# Altium footprint library Kon_Tipk.PCBLIB: 113 footprints (part 7 of 8)
Each footprint in its own frame and in the unit in brackets; x right, y up, seen from the top. Pads: shape width x height; smd on the part's side, far side on the other; paste and mask are expansions set on the pad; w line width, h text height; cw(c..) or ccw(c..) is an arc to the next point about the centre after c.
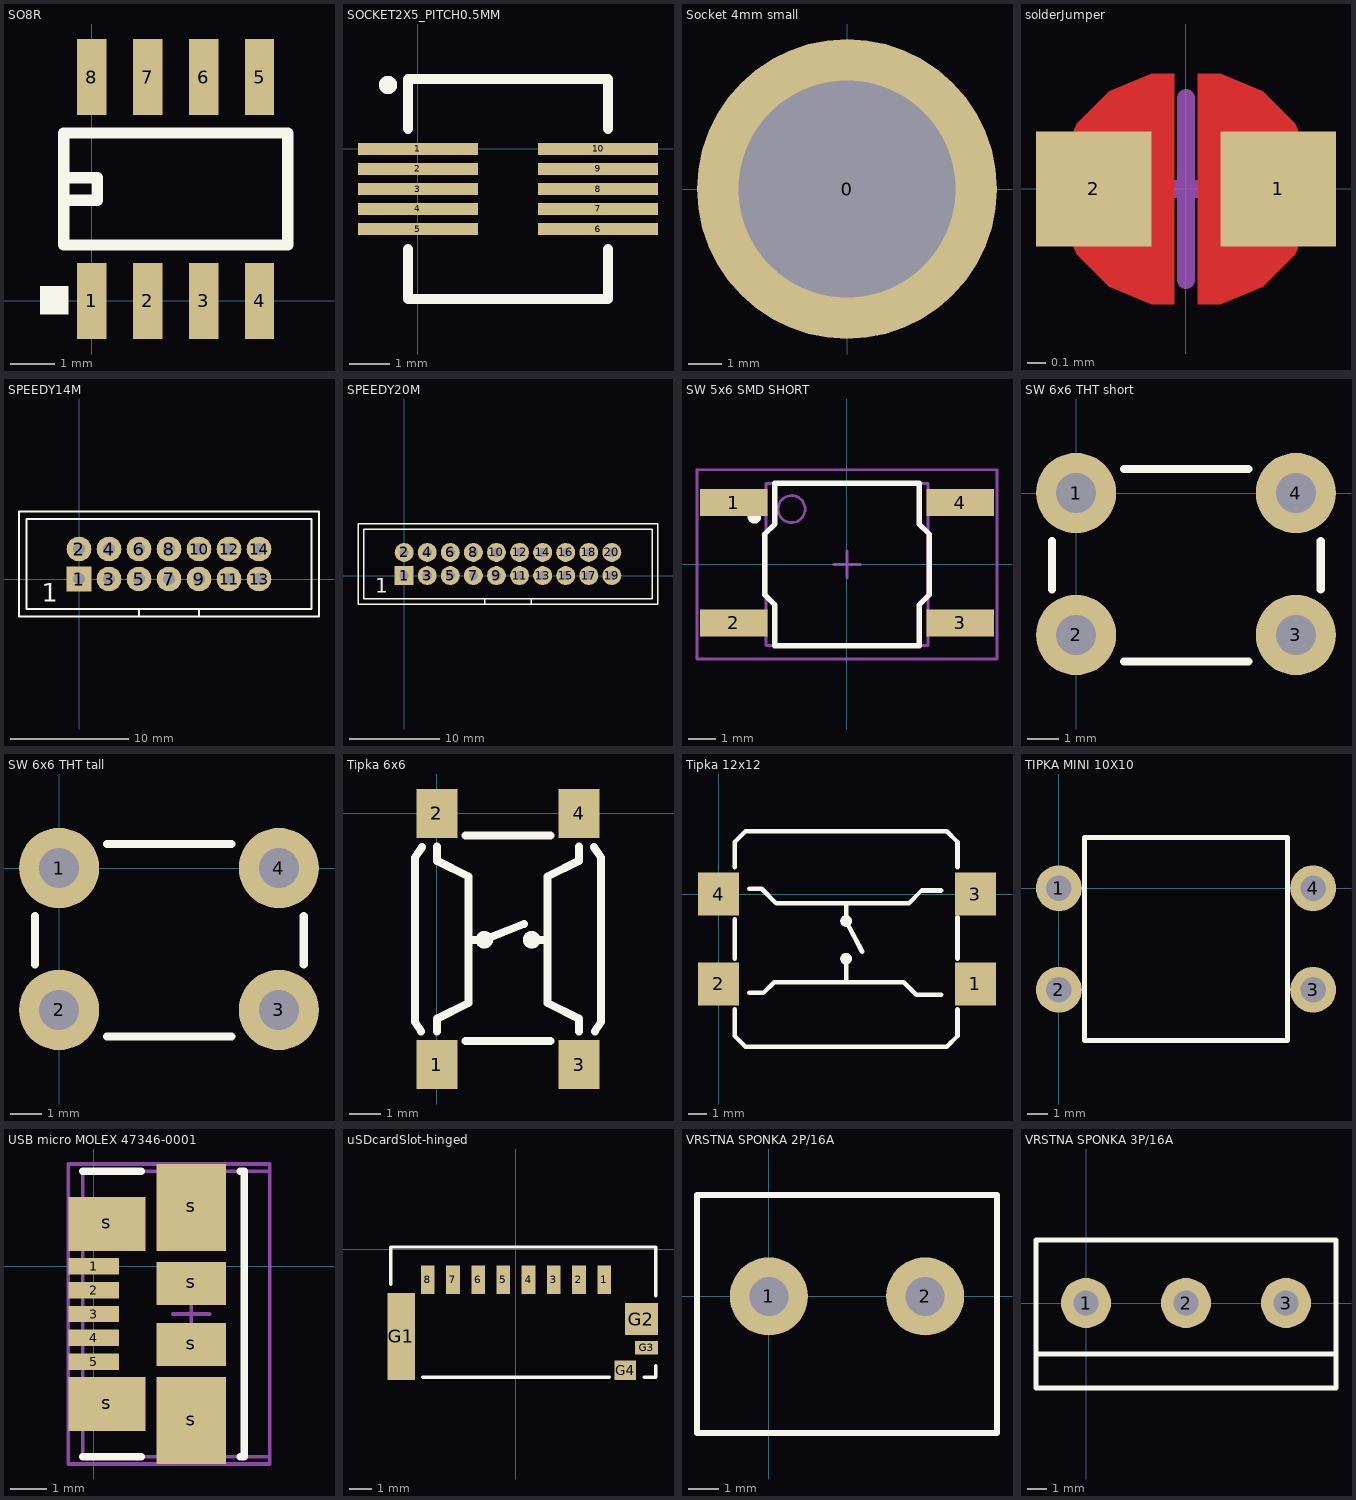
[diagram p6: the footprints below, top view; thin cyan lines are the x and y axes]

## SO8R [mil]
pads (11):
  rect 26x68 smd: 1(0,0) 2(50,0) 3(100,0) 4(150,0) 5(150,200) 6(100,200) 7(50,200) 8(0,200)
  round 0 all layers, no hole: 9(150,100) 10(75,100) 11(0,100)
Top Overlay:
  region: -21,13 -46,13 -46,-12 -21,-12
  lines w10: -25,90 5,90 5,110 -25,110 ; -25,50 -25,150 175,150 175,50 -25,50

## SOCKET2X5_PITCH0.5MM [mm]
pads (10):
  rect 3x0.3 smd: 1(0,0) 2(0,-0.5) 3(0,-1) 4(0,-1.5) 5(0,-2) 6(4.5,-2) 7(4.5,-1.5) 8(4.5,-1) 9(4.5,-0.5) 10(4.5,0)
Top Layer:
  circle w0.254: c-0.75,1.6 r0.1
Top Overlay:
  circle w0.254: c-0.75,1.6 r0.1
  lines w0.254: -0.25,-2.5 -0.25,-3.75 4.75,-3.75 4.75,-2.5 ; -0.25,0.5 -0.25,1.75 4.75,1.75 4.75,0.5

## Socket 4mm small [mm]
pads (1):
  round 9 hole 6.5: 0(0,0)

## solderJumper [mil]
height 314.96
pads (2):
  rect 25x25 smd: 1(20,0) 2(-20,0)
Top Layer:
  region: -2.51,25 -7.48,25 -16.67,21.19 -23.7,14.16 -27.51,4.97 -27.51,0 -27.51,-4.97 -23.7,-14.16 -16.67,-21.19 -7.48,-25 -2.51,-25
  region: 2.51,25 7.48,25 16.67,21.19 23.7,14.16 27.51,4.97 27.51,0 27.51,-4.97 23.7,-14.16 16.67,-21.19 7.48,-25 2.51,-25
Top Courtyard:
  lines w3.94: -19.69,0 19.68,0 ; 0,-19.69 0,19.68

## SPEEDY14M [mil]
pads (14):
  rect 82x82 hole 39.37: 1(0,0)
  round 82 hole 39.37: 2(0,100) 3(100,0) 4(100,100) 5(200,0) 6(200,100) 7(300,0) 8(300,100) 9(400,0) 10(400,100) 11(500,0) 12(500,100) 13(600,0) 14(600,100)
Top Overlay:
  lines w5.91: 200,-125 200,-100 ; 400,-125 400,-100 ; -200,-125 -200,225 800,225 800,-125 -200,-125 ; -175,-100 -175,200 775,200 775,-100 -175,-100
  text "1" at -125,-75 h62.5

## SPEEDY20M [mil]
pads (20):
  rect 82x82 hole 39.37: 1(0,0)
  round 82 hole 39.37: 2(0,100) 3(100,0) 4(100,100) 5(200,0) 6(200,100) 7(300,0) 8(300,100) 9(400,0) 10(400,100) 11(500,0) 12(500,100) 13(600,0) 14(600,100) 15(700,0) 16(700,100) 17(800,0) 18(800,100) 19(900,0) 20(900,100)
Top Overlay:
  lines w5.91: 350,-125 350,-100 ; 550,-125 550,-100 ; -200,-125 1100,-125 1100,225 -200,225 -200,-125 ; -175,-100 1075,-100 1075,200 -175,200 -175,-100
  text "1" at -125,-75 h62.5

## SW 5x6 SMD SHORT [mm]
height 5
pads (4):
  rect 2.5x1 smd: 1(-4.191,2.286) 2(-4.191,-2.159) 3(4.191,-2.159) 4(4.191,2.286)
Top Overlay:
  circle w0.25: c-3.425,1.76 r0.125
  lines w0.2: -3.048,-1.119 -2.667,-1.5 -2.667,-3 2.667,-3 2.667,-1.5 3.048,-1.119 3.048,1.119 2.667,1.5 2.667,3 -2.667,3 -2.667,1.5 -3.048,1.119 -3.048,-1.119
Mechanical 13:
  circle w0.1: c-2.05,2.05 r0.5
  lines w0.1: -3,-3 3,-3 3,3 -3,3 -3,-3
Top Courtyard:
  lines w0.1: -0.5,0 0.5,0 ; 0,-0.5 0,0.5 ; -5.55,-3.5 5.55,-3.5 5.55,3.5 -5.55,3.5 -5.55,-3.5
3D body "User Library-switch.step": height 5, standoff 0, extent -4.445,-2.921 4.555,3.079

## SW 6x6 THT short [mil]
pads (4):
  round 100 hole 50: 1(0,0) 2(0,-177) 3(274,-177) 4(274,0)
Top Overlay:
  lines w10: -30,-120 -30,-60 ; 60,-210 215,-210 ; 60,30 215,30 ; 305,-120 305,-60
3D body "User Library-diptronics tactile dts-63k.step": height 275.59, standoff -137.8, extent -18.51,-211 292.51,33.09

## SW 6x6 THT tall [mil]
pads (4):
  round 100 hole 50: 1(0,0) 2(0,-177) 3(274,-177) 4(274,0)
Top Overlay:
  lines w10: -30,-120 -30,-60 ; 60,-210 215,-210 ; 60,30 215,30 ; 305,-120 305,-60
3D body "User Library-Panasonic-EVQPA-Pushbutton.step": height 374.62, standoff -137.19, extent -23.65,-207 299.65,29.22

## Tipka 6x6 [mm]
pads (5):
  rect 1.3x1.55 smd: 1(0,-7.95) 2(0,0) 2(0,0) 3(4.5,-7.95) 4(4.5,0)
Top Overlay:
  circle w0.2: c1.5,-4 r0.18
  circle w0.2: c3,-4 r0.18
  lines w0.254: -0.5,-6.9 -0.7,-6.6 -0.7,-1.4 -0.477,-1.065 ; 0,-6.9 0,-6.8 0,-6.5 1,-6 1,-2 0,-1.5 0,-1.05 ; 0.9,-7.2 3.6,-7.2 ; 0.9,-0.7 3.6,-0.7 ; 1.1,-4 1.5,-4 2.75,-3.5 ; 3,-4 3.4,-4 ; 4.5,-6.9 4.5,-6.5 3.5,-6 3.5,-2 4.5,-1.5 4.5,-1.05 ; 4.977,-1.065 5.2,-1.4 5.2,-6.6 5,-6.9
3D body "CircuitWorks-TACT SMD 6X6.step": height 5, standoff -0.05, extent -0.7,-8.075 5.3,0.075

## Tipka 12x12 [mm]
pads (4):
  rect 2.3x2.4 smd: 1(14.3,-5) 2(0,-5) 3(14.3,0) 4(0,0)
Top Overlay:
  circle w0.254: c7.1,-3.6 r0.2
  circle w0.254: c7.1,-1.5 r0.2
  lines w0.254: 0.9,-6.4 0.9,-7.9 1.5,-8.5 12.7,-8.5 13.3,-7.9 13.3,-6.4 ; 0.9,-3.6 0.9,-1.4 ; 0.9,1.5 0.9,2.9 1.5,3.5 12.7,3.5 13.3,2.9 13.3,1.5 ; 1.7,-5.5 2.5,-5.5 3.1,-4.9 10.3,-4.9 11,-5.6 11.9,-5.6 ; 1.7,0.3 2.4,0.3 3.2,-0.5 10.6,-0.5 11.3,0.2 12,0.2 12.4,0.2 ; 7.1,-4.9 7.1,-3.7 7.1,-3.5 ; 7.1,-0.5 7.1,-1.5 8,-3.2 ; 11.5,-5.6 12.4,-5.6 ; 13.3,-3.6 13.3,-1.3
3D body "User Library-SWT_12x12_SMD.step": height 4, standoff 0, extent 0.413,-8.479 13.863,3.521

## TIPKA MINI 10X10 [mil]
pads (4):
  round 90 hole 50: 1(0,0) 2(0,-200) 3(500,-200) 4(500,0)
Top Overlay:
  lines w10: 50,-300 450,-300 450,100 50,100 50,-300

## USB micro MOLEX 47346-0001 [mm] "Micro USB socket"
height 2.94
pads (11):
  rect 1.38x0.45 smd: 1(0,0) 2(0,-0.65) 3(0,-1.3) 4(0,-1.95) 5(0,-2.6)
  rect 2.1x1.475 smd: s(0.36,-3.762) s(0.36,1.162)
  rect 1.9x2.375 smd: s(2.66,-4.213) s(2.66,1.613)
  rect 1.9x1.175 smd: s(2.66,-2.137) s(2.66,-0.463)
Top Overlay:
  lines w0.2: -0.3,-5.2 1.3,-5.2 ; -0.3,2.6 1.3,2.6 ; 4,-5.2 4.11,-5.2 4.11,2.6 4,2.6
Mechanical 13:
  lines w0.1: -0.3,-5.2 -0.3,2.6 4.81,2.6 4.81,-5.2 -0.3,-5.2
Top Courtyard:
  lines w0.1: 2.16,-1.3 3.16,-1.3 ; 2.66,-1.8 2.66,-0.8 ; -0.7,-5.4 -0.7,2.8 4.81,2.8 4.81,-5.4 -0.7,-5.4
3D body "User Library-Micro USB.step": height 2.74, standoff -0.2, extent -0.223,-5.285 5.207,2.695

## uSDcardSlot-hinged [mm]
pads (12):
  rect 0.6x1.25 smd: 1(3.85,-1.325) 2(2.75,-1.325) 3(1.65,-1.325) 4(0.55,-1.325) 5(-0.55,-1.325) 6(-1.65,-1.325) 7(-2.75,-1.325) 8(-3.85,-1.325)
  rect 1.2x3.79 smd: G1(-5,-3.805)
  rect 1.45x1.4 smd: G2(5.475,-3.05)
  rect 1x0.6 smd: G3(5.7,-4.3)
  rect 0.95x0.85 smd: G4(4.775,-5.275)
Top Overlay:
  lines w0.15: -5.461,-1.524 -5.461,0.102 6.096,0.102 6.096,-2.032 ; -4.064,-5.588 4.064,-5.588 ; 5.588,-5.588 6.096,-5.588 6.096,-5.08
3D body "uSD-Molex47309-2651.stp": height 2.61, standoff -0.04, extent -5.4,-5.475 6,0.025
3D body "User Library-Micro_SD.step": height 2.55, standoff 1.57, extent -4.955,-15.171 6.045,-0.171

## VRSTNA SPONKA 2P/16A [mm]
pads (2):
  round 2.54 hole 1.27: 1(0,0) 2(5.08,0)
Top Overlay:
  lines w0.2: -2.337,-4.445 7.417,-4.445 7.417,3.302 -2.337,3.302 -2.337,-4.445
3D body "User Library-TB2.STEP": height 10.01, standoff -3.49, extent -2.46,-4.571 7.54,3.429

## VRSTNA SPONKA 3P/16A [mm]
pads (3):
  round 2.54 hole 1.27: 1(0,0) 2(5.08,0) 3(10.16,0)
Top Overlay:
  lines w0.254: -2.54,-2.591 12.58,-2.591 ; -2.54,-4.318 -2.54,-2.5 -2.54,3.2 12.7,3.2 12.7,-4.318 -2.54,-4.318
3D body "User Library-Terminal block 3 POS.STEP": height 10, standoff -3.05, extent -2.54,-4.327 12.7,3.173